# Altium footprint library Sajad_Altium_Library.PcbLib: 333 footprints (part 7 of 21)
Each footprint in its own frame and in the unit in brackets; x right, y up, seen from the top. Pads: shape width x height; smd on the part's side, far side on the other; paste and mask are expansions set on the pad; w line width, h text height; cw(c..) or ccw(c..) is an arc to the next point about the centre after c.
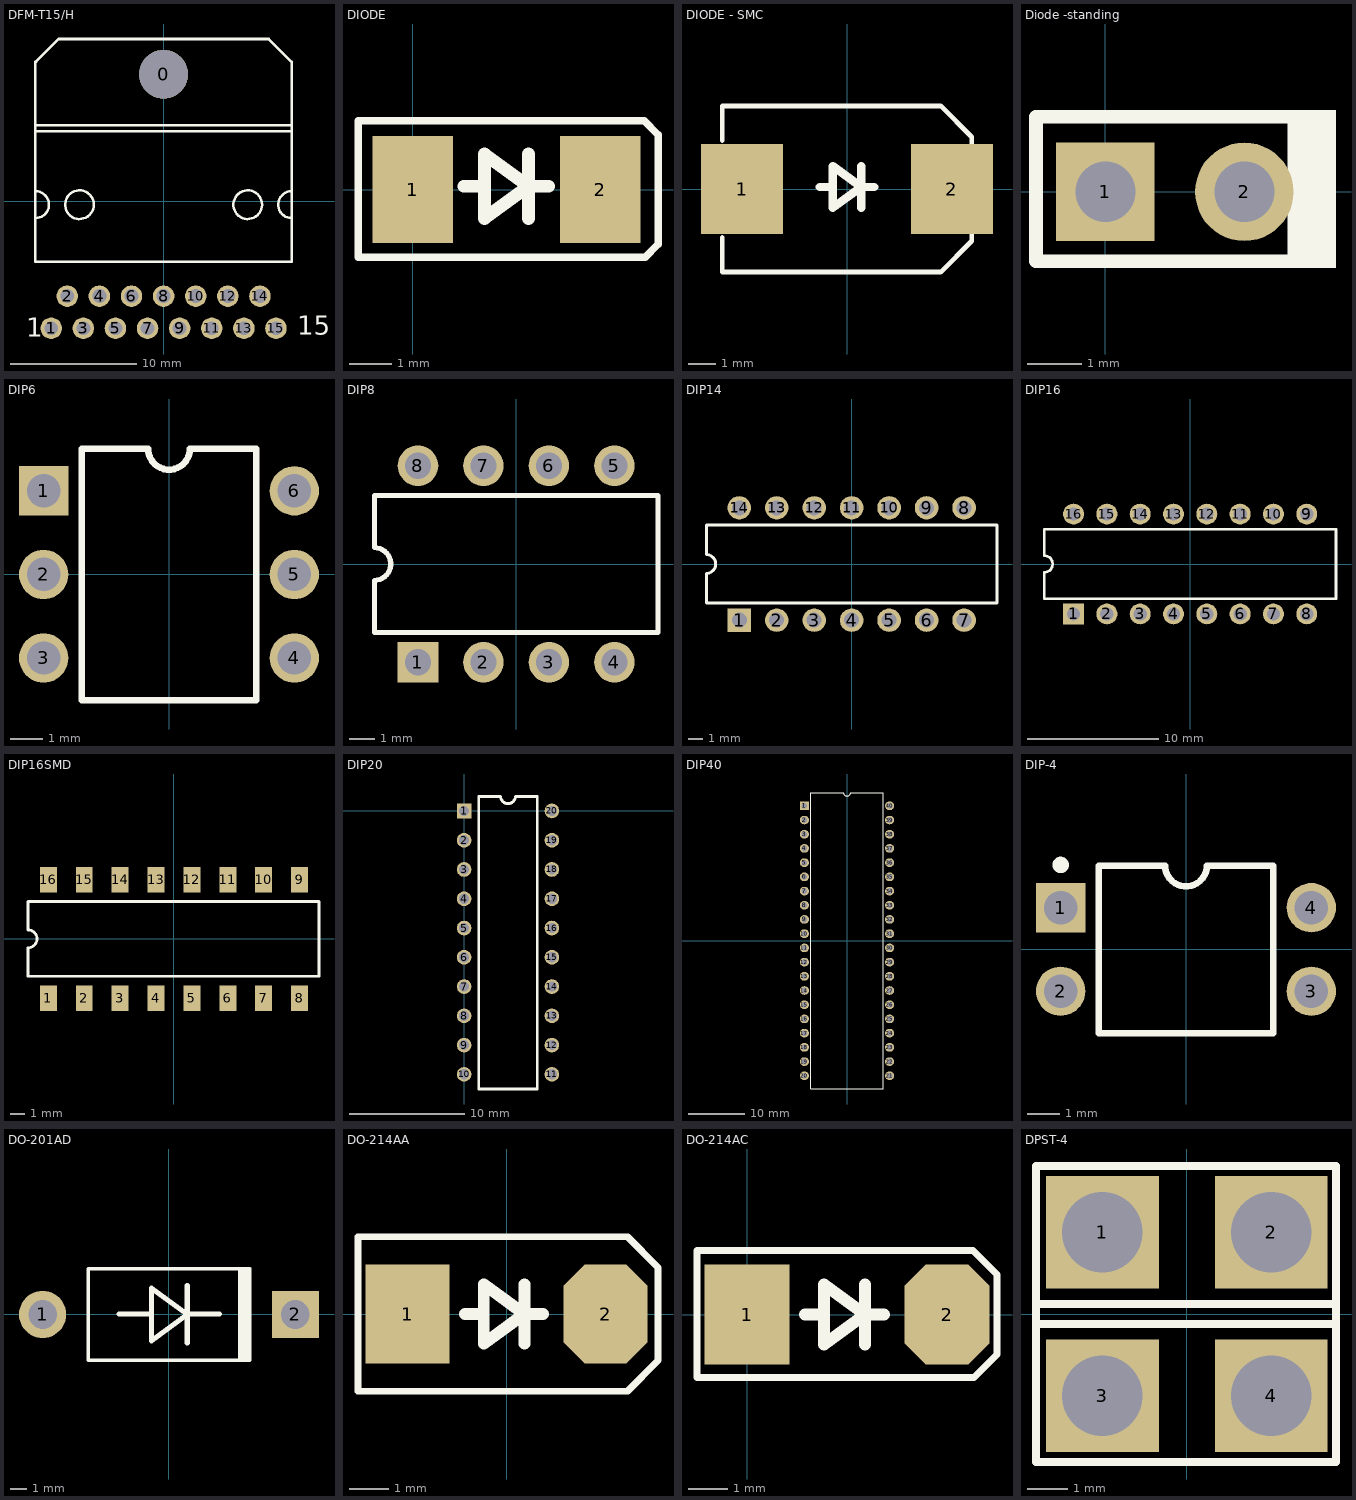
[diagram p6: the footprints below, top view; thin cyan lines are the x and y axes]

## DFM-T15/H [mm] "TO, Thru-Hole, Horizontal, Heatsink Mounted; 15 Bent Staggered Leads; Pitch 1.27 mm"
height 4.62
pads (16):
  round 3.86 hole 3.86: 0(0,10.045)
  round 1.7 hole 1.1: 1(-8.89,-10.045) 2(-7.62,-7.505) 3(-6.35,-10.045) 4(-5.08,-7.505) 5(-3.81,-10.045) 6(-2.54,-7.505) 7(-1.27,-10.045) 8(0,-7.505) 9(1.27,-10.045) 10(2.54,-7.505) 11(3.81,-10.045) 12(5.08,-7.505) 13(6.35,-10.045) 14(7.62,-7.505) 15(8.89,-10.045)
Top Overlay:
  circle w0.2: c-6.656,-0.271 r1.136
  circle w0.2: c6.656,-0.271 r1.136
  lines w0.2: -10.135,-1.336 ccw(c-10.135,-0.271) -10.135,0.795 ; -10.135,5.555 10.135,5.555 ; -10.135,6.025 10.135,6.025 ; -10.135,11.05 -10.135,11.045 -10.135,-4.794 10.135,-4.795 10.135,11.045 ; -10.09,11.045 -8.3,12.836 8.3,12.836 10.09,11.045 ; 10.135,-1.336 cw(c10.135,-0.271) 10.135,0.795
  text "15" at 10.554,-10.556 h1.5
  text "1" at -10.863,-10.731 h1.5
3D body: height 5, standoff -1.5, extent -9.796,-10.301 9.804,13.299

## DIODE [mm] "1N4001-7"
pads (2):
  rect 1.905x2.54 smd: 1(0,0) 2(4.445,0)
Top Overlay:
  lines w0.178: -1.295,-1.6 -1.295,1.626 3.404,1.626 5.486,1.626 5.817,1.295 5.817,-1.295 5.512,-1.6 3.378,-1.6 -1.295,-1.6
  lines w0.305: 2.743,-0.686 2.743,0.838 ; 3.226,0.076 2.743,0.076 ; 2.743,0.076 1.702,0.838 1.702,-0.686 2.743,0.076 ; 1.219,0.076 1.702,0.076 1.219,0.076

## DIODE - SMC [mm]
pads (2):
  rect 3x3.302 smd: 1(-3.847,0) 2(3.847,0)
Top Overlay:
  lines w0.178: -4.572,-1.778 -4.572,-3.048 3.429,-3.048 4.572,-1.905 4.572,-1.651 ; -4.572,1.778 -4.572,3.048 3.429,3.048 4.572,1.905 4.572,1.651
  lines w0.305: 0.521,-0.686 0.521,0.838 ; 1.003,0.076 0.521,0.076 ; 0.521,0.076 -0.521,-0.686 -0.521,0.838 0.521,0.076 ; -1.003,0.076 -0.521,0.076 -1.003,0.076
3D body: height 4.4, standoff 1.95, extent -3.9,-2.95 3.9,2.95

## Diode -standing [mm] "Axial"
height 6.5
pads (2):
  rect 1.8x1.8 hole 1.1: 1(0,0)
  round 1.8 hole 1.1: 2(2.54,0)
Top Overlay:
  rectangle: 3.327,-1.397 4.216,1.499
  lines w0.254: -1.245,1.372 -1.27,1.372 ; 3.556,-1.27 -1.27,-1.27 -1.27,1.372 ; 3.556,1.372 -1.27,1.372
3D body: height 6.49, standoff -1.91, extent -0.394,-1.333 3.874,1.334

## DIP6 [mm] "DIP; 6 Leads; Row Spacing 7.62 mm; Pitch 2.54 mm"
height 5.6
pads (6):
  rect 1.5x1.5 hole 1.016: 1(-3.81,2.54)
  round 1.5 hole 1.016: 2(-3.81,0) 3(-3.81,-2.54) 4(3.81,-2.54) 5(3.81,0) 6(3.81,2.54)
Top Overlay:
  lines w0.2: -2.65,-3.82 -2.65,3.82 -0.635,3.82 ccw(c0,3.82) 0.635,3.82 2.65,3.82 2.65,-3.82 -2.65,-3.82

## DIP8 [mil] "DIP; 8 Leads; Row Spacing 7.62 mm; Pitch 2.54 mm"
height 200
pads (8):
  rect 62x62 hole 40: 1(-150,-150)
  round 62 hole 40: 2(-50,-150) 3(50,-150) 4(150,-150) 5(150,150) 6(50,150) 7(-50,150) 8(-150,150)
Top Overlay:
  lines w7.87: -216.53,-104.33 -216.53,-25 ccw(c-216.53,0) -216.53,25 -216.53,104.33 216.53,104.33 216.53,-104.33 -216.53,-104.33
3D body: height 200, standoff -137.8, extent -219.96,-153.84 209.96,156

## DIP14 [mil] "DIP; 14 Leads; Row Spacing 7.62 mm; Pitch 2.54 mm"
height 200
pads (14):
  rect 63x62 hole 40: 1(-300,-150)
  oval 63x62 hole 40: 2(-200,-150) 3(-100,-150) 4(0,-150) 5(100,-150) 6(200,-150) 7(300,-150) 8(300,150) 9(200,150) 10(100,150) 11(0,150) 12(-100,150) 13(-200,150) 14(-300,150)
Top Overlay:
  lines w7.87: -387.8,-104.33 -387.8,-25 ccw(c-387.8,0) -387.8,25 -387.8,104.33 387.79,104.33 387.79,-104.33 -387.8,-104.33
3D body: height 200.79, standoff -129.92, extent -393.71,-154.92 393.7,154.92

## DIP16 [mil] "DIP; 16 Leads; Row Spacing 7.62 mm; Pitch 2.54 mm"
height 200
pads (16):
  rect 63x62 hole 40: 1(-350,-150)
  oval 63x62 hole 40: 2(-250,-150) 3(-150,-150) 4(-50,-150) 5(50,-150) 6(150,-150) 7(250,-150) 8(350,-150) 9(350,150) 10(250,150) 11(150,150) 12(50,150) 13(-50,150) 14(-150,150) 15(-250,150) 16(-350,150)
Top Overlay:
  lines w7.87: -437.8,-104.33 437.79,-104.33 437.79,104.33 -437.8,104.33 -437.8,25 cw(c-437.8,0) -437.8,-25 -437.8,-104.33
3D body: height 200.79, standoff -129.92, extent -392.69,-154.92 394.71,154.92

## DIP16SMD [mm] "DIP; 16 Leads; Row Spacing 7.62 mm; Pitch 2.54 mm"
height 5.08
pads (16):
  rect 1.2x1.8 smd: 1(-8.89,-4.191) 2(-6.35,-4.191) 3(-3.81,-4.191) 4(-1.27,-4.191) 5(1.27,-4.191) 6(3.81,-4.191) 7(6.35,-4.191) 8(8.89,-4.191) 9(8.89,4.166) 10(6.35,4.166) 11(3.81,4.166) 12(1.27,4.166) 13(-1.27,4.166) 14(-3.81,4.166) 15(-6.35,4.166) 16(-8.89,4.166)
Top Overlay:
  lines w0.2: -10.338,-2.65 10.262,-2.65 10.262,2.65 -10.338,2.65 ; -10.333,-2.65 -10.333,-0.635 ccw(c-10.333,0) -10.333,0.635 -10.333,2.65
3D body: height 5.1, standoff -3.3, extent -10,-3.935 10,3.935

## DIP20 [mil]
pads (20):
  rect 50x50 hole 35: 1(0,0)
  round 50 hole 35: 2(0,-100) 3(0,-200) 4(0,-300) 5(0,-400) 6(0,-500) 7(0,-600) 8(0,-700) 9(0,-800) 10(0,-900) 11(300,-900) 12(300,-800) 13(300,-700) 14(300,-600) 15(300,-500) 16(300,-400) 17(300,-300) 18(300,-200) 19(300,-100) 20(300,0)
Top Overlay:
  lines w10: 50,-950 50,50 125,50 ccw(c150,50) 175,50 250,50 250,-950 50,-950

## DIP40 [mil] "DIP 40 pin"
pads (40):
  rect 65x60 hole 40: 1(-300,950)
  oval 65x60 hole 40: 2(-300,850) 3(-300,750) 4(-300,650) 5(-300,550) 6(-300,450) 7(-300,350) 8(-300,250) 9(-300,150) 10(-300,50) 11(-300,-50) 12(-300,-150) 13(-300,-250) 14(-300,-350) 15(-300,-450) 16(-300,-550) 17(-300,-650) 18(-300,-750) 19(-300,-850) 20(-300,-950) 21(300,-950) 22(300,-850) 23(300,-750) 24(300,-650) 25(300,-550) 26(300,-450) 27(300,-350) 28(300,-250) 29(300,-150) 30(300,-50) 31(300,50) 32(300,150) 33(300,250) 34(300,350) 35(300,450) 36(300,550) 37(300,650) 38(300,750) 39(300,850) 40(300,950)
Top Overlay:
  lines w7.87: -253.94,-1043.31 -253.94,1043.31 -25,1043.31 ccw(c0,1043.31) 25,1043.31 253.94,1043.31 253.94,-1043.31 -253.94,-1043.31
3D body: height 216.54, standoff -153.54, extent -301.18,-984.25 301.18,984.25

## DIP-4 [mm] "DIP; 4 Leads; Row Spacing 7.62 mm; Pitch 2.54 mm"
height 5.6
pads (4):
  rect 1.5x1.5 hole 1.016: 1(-3.81,1.27)
  round 1.5 hole 1.016: 2(-3.81,-1.27) 3(3.81,-1.27) 4(3.81,1.27)
Top Overlay:
  circle w0.25: c-3.81,2.57 r0.125
  lines w0.2: -2.65,-2.55 2.65,-2.55 2.65,2.55 0.635,2.55 cw(c0,2.55) -0.635,2.55 -2.65,2.55 -2.65,-2.55
3D body: height 4.31, standoff -3.28, extent -4,-2.77 4,2.77

## DO-201AD [mm] "Diode, Axial; Body 9.5 x 5.6 mm (LxDia. max), Lead Dia. 1.32 mm (max)"
height 5.6
pads (2):
  round 2.8 hole 1.7: 1(-7.5,0)
  rect 2.8x2.8 hole 1.7: 2(7.5,0)
Top Overlay:
  rectangle: 4.09,-2.743 4.89,2.8
  lines w0.2: 4.79,-2.724 -4.801,-2.724 -4.801,2.724 4.79,2.724
  lines w0.305: -2.972,0.025 -1.041,0.025 ; 1.079,-1.682 1.079,0.052 ; 1.079,1.727 1.079,-0.007 -1.041,-1.559 -1.041,1.559 1.058,0.023 2.988,0.023
3D body: height 7.6, standoff -4, extent -8.305,-2.794 8.255,2.806

## DO-214AA [mil] "DO-214AA (SMB)"
pads (2):
  rect 85x100 smd: 1(-100,0)
  oct 85x100 smd: 2(100,0)
Top Overlay:
  lines w7: -150,-78 -150,78 122,78 153,47 153,-47 122,-78 -150,-78
  lines w12: 18,-30 18,30 ; 37,0 18,0 ; 18,0 -23,30 -23,-30 18,0 ; -42,0 -23,0 -42,0
3D body: height 86.65, standoff -1.97, extent -104.33,-72.84 104.33,72.83

## DO-214AC [mil] "1N4001-7 SMD DIODE"
pads (2):
  rect 85x100 smd: 1(0,0)
  oct 85x100 smd: 2(200,0)
Top Overlay:
  lines w7: -50,-63 143,-63 227,-63 250,-40 250,40 226,64 144,64 -50,64 -50,-63
  lines w12: 118,-30 118,30 ; 137,0 118,0 ; 118,0 77,30 77,-30 118,0 ; 58,0 77,0 58,0
3D body: height 88.31, standoff -1.69, extent -8.01,-55 207.99,54.99

## DPST-4 [mm] "Double-Pole, Single-Throw Switch; 4 Leads"
pads (4):
  rect 2.8x2.8 hole 2: 1(-2.095,2.032) 2(2.095,2.032) 3(-2.095,-2.032) 4(2.095,-2.032)
Top Overlay:
  lines w0.2: -3.746,-0.254 3.708,-0.254 ; -3.746,0.254 3.708,0.254 ; -3.746,-3.683 3.708,-3.683 3.708,3.683 -3.746,3.683 -3.746,-3.683